# Altium footprint library FootprintSMD.PcbLib: 140 footprints (part 3 of 9)
Each footprint in its own frame and in the unit in brackets; x right, y up, seen from the top. Pads: shape width x height; smd on the part's side, far side on the other; paste and mask are expansions set on the pad; w line width, h text height; cw(c..) or ccw(c..) is an arc to the next point about the centre after c.
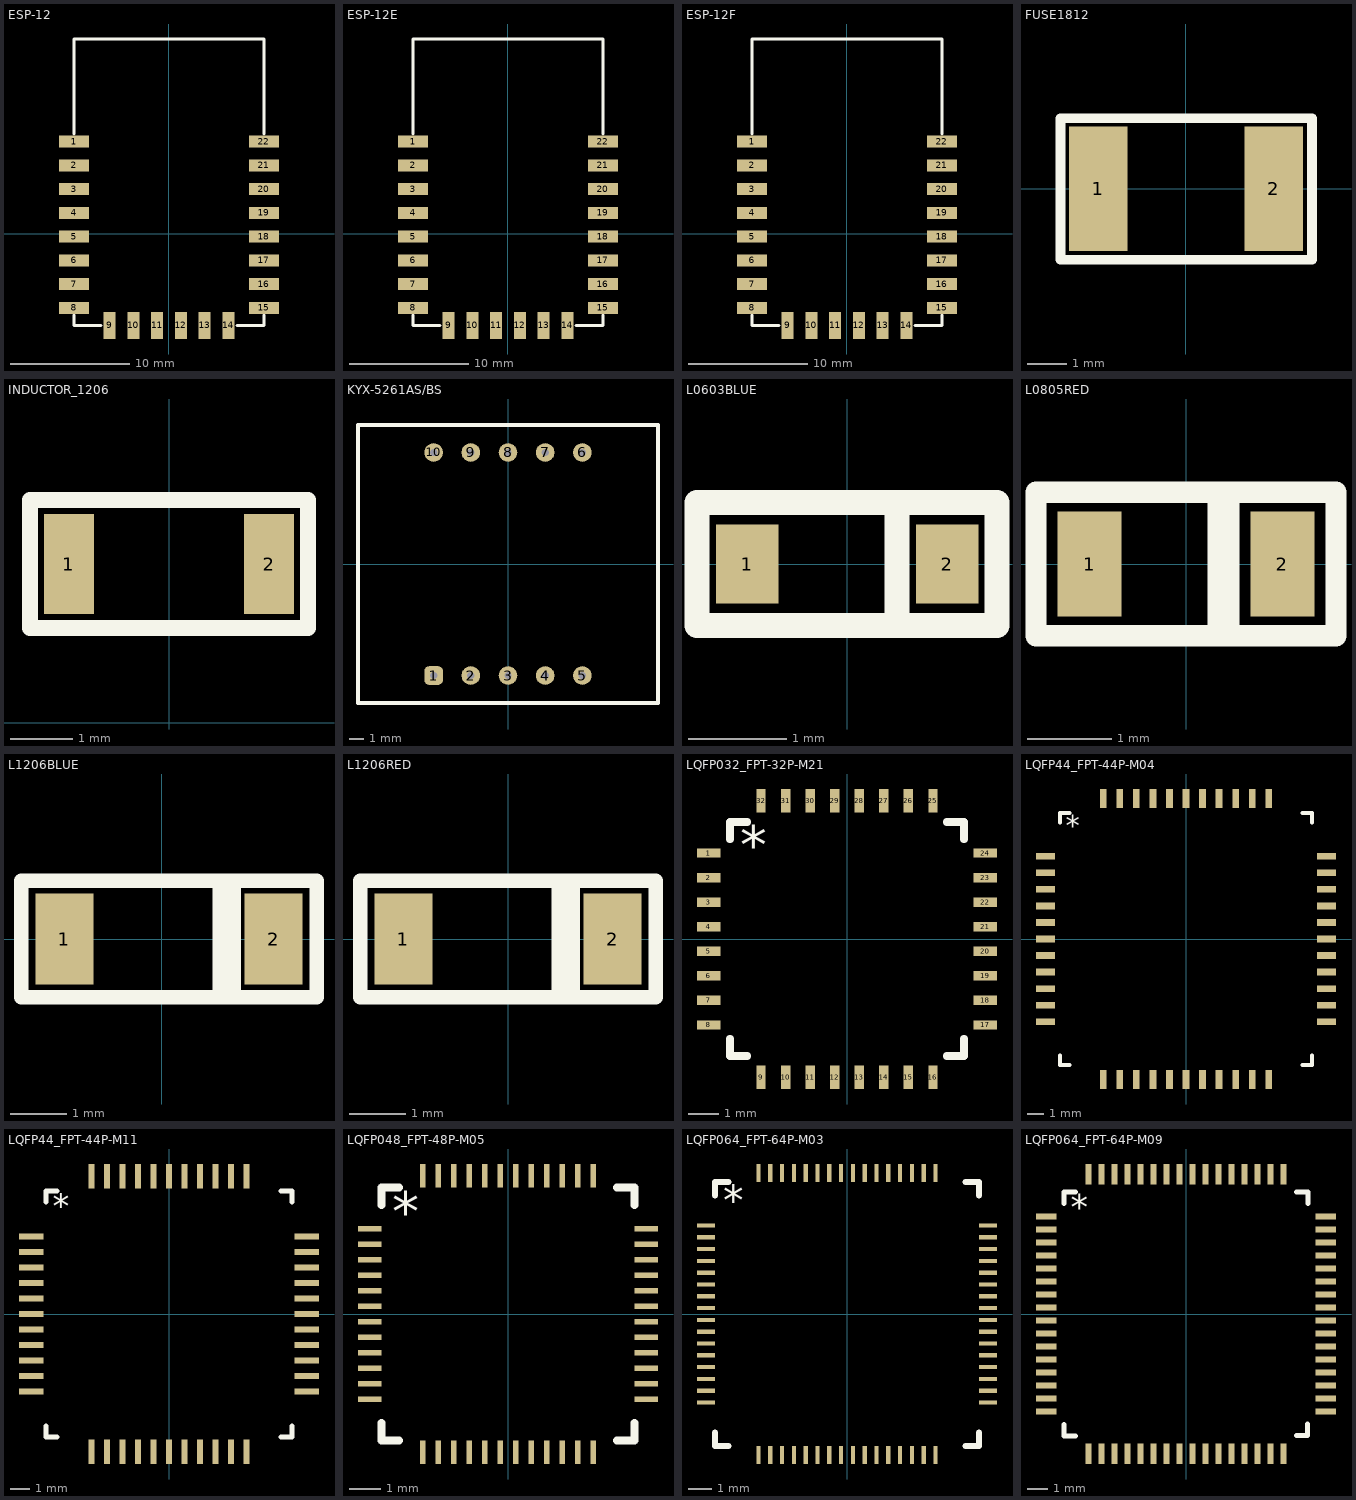
[diagram p2: the footprints below, top view; thin cyan lines are the x and y axes]

## ESP-12 [mil]
pads (22):
  rect 100x40 smd: 1(-314.96,304.65) 2(-314.96,225.91) 3(-314.96,147.17) 4(-314.96,68.43) 5(-314.96,-10.31) 6(-314.96,-89.06) 7(-314.96,-167.8) 8(-314.96,-246.54) 15(314.96,-246.54) 16(314.96,-167.8) 17(314.96,-89.06) 18(314.96,-10.31) 19(314.96,68.43) 20(314.96,147.17) 21(314.96,225.91) 22(314.96,304.65)
  rect 40x90 smd: 9(-196.85,-304.65) 10(-118.11,-304.65) 11(-39.37,-304.65) 12(39.37,-304.65) 13(118.11,-304.65) 14(196.85,-304.65)
Top Overlay:
  lines w10: -314.96,-270 -314.96,-305 -225,-305 ; -314.96,330 -314.96,645 314.96,645 314.96,330 ; 225,-305 314.96,-305 314.96,-270
3D body "ESP-12.step": height 114.17, standoff -1.97, extent -314.95,-302.44 314.97,642.45

## ESP-12E [mil]
pads (22):
  rect 100x40 smd: 1(-314.96,304.65) 2(-314.96,225.91) 3(-314.96,147.17) 4(-314.96,68.43) 5(-314.96,-10.31) 6(-314.96,-89.06) 7(-314.96,-167.8) 8(-314.96,-246.54) 15(314.96,-246.54) 16(314.96,-167.8) 17(314.96,-89.06) 18(314.96,-10.31) 19(314.96,68.43) 20(314.96,147.17) 21(314.96,225.91) 22(314.96,304.65)
  rect 40x90 smd: 9(-196.85,-304.65) 10(-118.11,-304.65) 11(-39.37,-304.65) 12(39.37,-304.65) 13(118.11,-304.65) 14(196.85,-304.65)
Top Overlay:
  lines w10: -314.96,-270 -314.96,-305 -225,-305 ; -314.96,330 -314.96,645 314.96,645 314.96,330 ; 225,-305 314.96,-305 314.96,-270
3D body "ESP-12E.step": height 114.17, standoff -1.97, extent -314.96,-305 314.96,639.88

## ESP-12F [mil]
pads (22):
  rect 100x40 smd: 1(-314.96,304.65) 2(-314.96,225.91) 3(-314.96,147.17) 4(-314.96,68.43) 5(-314.96,-10.31) 6(-314.96,-89.06) 7(-314.96,-167.8) 8(-314.96,-246.54) 15(314.96,-246.54) 16(314.96,-167.8) 17(314.96,-89.06) 18(314.96,-10.31) 19(314.96,68.43) 20(314.96,147.17) 21(314.96,225.91) 22(314.96,304.65)
  rect 40x90 smd: 9(-196.85,-304.65) 10(-118.11,-304.65) 11(-39.37,-304.65) 12(39.37,-304.65) 13(118.11,-304.65) 14(196.85,-304.65)
Top Overlay:
  lines w10: -314.96,-270 -314.96,-305 -225,-305 ; -314.96,330 -314.96,645 314.96,645 314.96,330 ; 225,-305 314.96,-305 314.96,-270
3D body "ESP-12F.step": height 114.17, standoff -1.97, extent -314.96,-305.01 314.96,639.87

## FUSE1812 [mm]
pads (2):
  rect 1.5x3.2 smd: 1(-2.25,0) 2(2.25,0)
Top Overlay:
  lines w0.254: -3.219,-1.823 3.233,-1.823 3.233,1.809 -3.219,1.809 -3.219,-1.823
3D body "ALSRobot-Fuse 1812.STEP": height 1.03, standoff 0, extent -2.37,-1.74 2.365,1.74

## INDUCTOR_1206 [mm]
pads (2):
  rect 0.8x1.6 smd: 1(-1.6,2.54) 2(1.6,2.54)
Top Overlay:
  lines w0.254: -2.225,1.515 2.225,1.515 2.225,3.565 -2.225,3.565 -2.225,1.515
3D body "7447916.stp": height 1.1, standoff 0, extent -1.6,1.74 1.6,3.34

## KYX-5261AS/BS [mm] "0.56inch 2digits red 7 segment led display 10pin"
pads (10):
  rrect50% 1.27x1.27 hole 0.51: 1(-5.08,-7.62)
  round 1.27 hole 0.51: 2(-2.54,-7.62) 3(0,-7.62) 4(2.54,-7.62) 5(5.08,-7.62) 6(5.08,7.62) 7(2.54,7.62) 8(0,7.62) 9(-2.54,7.62) 10(-5.08,7.62)
Top Overlay:
  lines w0.254: -10.25,-9.5 -10.25,9.5 10.25,9.5 10.25,-9.5 -10.16,-9.5

## L0603BLUE [mil]
pads (2):
  rect 25x31.5 smd: 1(-40,0) 2(40,0)
Top Overlay:
  rectangle: 15,-25 25,25
  lines w10: -60,-24.61 -60,24.61 60,24.61 60,-24.61 -60,-24.61
3D body "User Library-SMD LED 0603.STEP": height 14.96, standoff -0.39, extent -31.5,-15.75 31.5,15.75

## L0805RED [mil]
pads (2):
  rect 30x48.82 smd: 1(-45,0) 2(45,0)
Top Overlay:
  rectangle: 10,-35 25,35
  lines w10: -70,-33.46 70,-33.46 70,33.46 -70,33.46 -70,-33.46
3D body "everlight-17-21-0805LED-red.STEP": height 43.31, standoff -0.39, extent -39.36,-24.6 39.38,24.61

## L1206BLUE [mil]
pads (2):
  rect 40x62.99 smd: 1(-67.5,0) 2(77.5,0)
Top Overlay:
  rectangle: 35,-40 55,40
  lines w10: -97.5,-40.35 107.5,-40.35 107.5,40.35 -97.5,40.35 -97.5,-40.35
3D body "User Library-LED 1206 BLUE.STEP": height 43.31, standoff 0, extent -57.99,-31.49 67.99,31.51

## L1206RED [mil]
pads (2):
  rect 40x62.99 smd: 1(-72.5,0) 2(72.5,0)
Top Overlay:
  rectangle: 30,-40 50,40
  lines w10: -102.5,-40.35 102.5,-40.35 102.5,40.35 -102.5,40.35 -102.5,-40.35
3D body "User Library-LED 1206 RED.STEP": height 43.31, standoff 0, extent -62.99,-31.49 62.99,31.5

## LQFP032_FPT-32P-M21 [mil]
pads (32):
  rect 30x12 smd: 1(-177.32,110.24) 2(-177.32,78.74) 3(-177.32,47.24) 4(-177.32,15.75) 5(-177.32,-15.75) 6(-177.32,-47.24) 7(-177.32,-78.74) 8(-177.32,-110.24) 17(177.32,-110.24) 18(177.32,-78.74) 19(177.32,-47.24) 20(177.32,-15.75) 21(177.32,15.75) 22(177.32,47.24) 23(177.32,78.74) 24(177.32,110.24)
  rect 12x30 smd: 9(-110.24,-177.32) 10(-78.74,-177.32) 11(-47.24,-177.32) 12(-15.75,-177.32) 13(15.75,-177.32) 14(47.24,-177.32) 15(78.74,-177.32) 16(110.24,-177.32) 25(110.24,177.32) 26(78.74,177.32) 27(47.24,177.32) 28(15.75,177.32) 29(-15.75,177.32) 30(-47.24,177.32) 31(-78.74,177.32) 32(-110.24,177.32)
Top Overlay:
  lines w10: -150,-127.87 -150,-150 -127.87,-150 ; -150,127.87 -150,150 -127.87,150 ; 127.87,-150 150,-150 150,-127.87 ; 127.87,150 150,150 150,127.87
  text "*" at -136.86,94.98 h50
3D body "LQFP32_FPT-32P-M21.stp": height 59.06, standoff 0, extent -177.16,-177.17 177.17,177.16

## LQFP44_FPT-44P-M04 [mil]
pads (44):
  rect 45x15.75 smd: 1(-335,196.85) 2(-335,157.48) 3(-335,118.11) 4(-335,78.74) 5(-335,39.37) 6(-335,0) 7(-335,-39.37) 8(-335,-78.74) 9(-335,-118.11) 10(-335,-157.48) 11(-335,-196.85) 23(335,196.85) 24(335,157.48) 25(335,118.11) 26(335,78.74) 27(335,39.37) 28(335,0) 29(335,-39.37) 30(335,-78.74) 31(335,-118.11) 32(335,-157.48) 33(335,-196.85)
  rect 15.75x45 smd: 12(-196.85,-335) 13(-157.48,-335) 14(-118.11,-335) 15(-78.74,-335) 16(-39.37,-335) 17(0,-335) 18(39.37,-335) 19(78.74,-335) 20(118.11,-335) 21(157.48,-335) 22(196.85,-335) 34(196.85,335) 35(157.48,335) 36(118.11,335) 37(78.74,335) 38(39.37,335) 39(0,335) 40(-39.37,335) 41(-78.74,335) 42(-118.11,335) 43(-157.48,335) 44(-196.85,335)
Top Overlay:
  lines w10: -300.03,-277.87 -300.03,-300 -277.89,-300 ; -300,277.89 -300,300.03 -277.87,300.03 ; 277.87,-300.03 300,-300.03 300,-277.89 ; 277.89,300 300.03,300 300.03,277.87
  text "*" at -286.66,245.01 h50
3D body "QFP44_FPT-44P-M04.stp": height 129.92, standoff 0, extent -338.58,-338.58 338.59,338.58

## LQFP44_FPT-44P-M11 [mm]
pads (44):
  rect 1.27x0.3 smd: 1(-7.112,4) 2(-7.112,3.2) 3(-7.112,2.4) 4(-7.112,1.6) 5(-7.112,0.8) 6(-7.112,0) 7(-7.112,-0.8) 8(-7.112,-1.6) 9(-7.112,-2.4) 10(-7.112,-3.2) 11(-7.112,-4) 23(7.112,-4) 24(7.112,-3.2) 25(7.112,-2.4) 26(7.112,-1.6) 27(7.112,-0.8) 28(7.112,0) 29(7.112,0.8) 30(7.112,1.6) 31(7.112,2.4) 32(7.112,3.2) 33(7.112,4)
  rect 0.3x1.27 smd: 12(-4,-7.112) 13(-3.2,-7.112) 14(-2.4,-7.112) 15(-1.6,-7.112) 16(-0.8,-7.112) 17(0,-7.112) 18(0.8,-7.112) 19(1.6,-7.112) 20(2.4,-7.112) 21(3.2,-7.112) 22(4,-7.112) 34(4,7.112) 35(3.2,7.112) 36(2.4,7.112) 37(1.6,7.112) 38(0.8,7.112) 39(0,7.112) 40(-0.8,7.112) 41(-1.6,7.112) 42(-2.4,7.112) 43(-3.2,7.112) 44(-4,7.112)
Top Overlay:
  lines w0.254: -6.35,-5.788 -6.35,-6.35 -5.788,-6.35 ; -6.35,5.788 -6.35,6.35 -5.788,6.35 ; 5.788,-6.35 6.35,-6.35 6.35,-5.788 ; 5.788,6.35 6.35,6.35 6.35,5.788
  text "*" at -6.011,4.953 h1.27
3D body "QFP44_FPT-44P-M11.stp": height 2.3, standoff 0, extent -7.2,-7.2 7.2,7.2

## LQFP048_FPT-48P-M05 [mil]
pads (48):
  rect 30x7 smd: 1(-175,108.27) 2(-175,88.58) 3(-175,68.9) 4(-175,49.21) 5(-175,29.53) 6(-175,9.84) 7(-175,-9.84) 8(-175,-29.53) 9(-175,-49.21) 10(-175,-68.9) 11(-175,-88.58) 12(-175,-108.27) 25(175,-108.27) 26(175,-88.58) 27(175,-68.9) 28(175,-49.21) 29(175,-29.53) 30(175,-9.84) 31(175,9.84) 32(175,29.53) 33(175,49.21) 34(175,68.9) 35(175,88.58) 36(175,108.27)
  rect 7x30 smd: 13(-108.27,-175) 14(-88.58,-175) 15(-68.9,-175) 16(-49.21,-175) 17(-29.53,-175) 18(-9.84,-175) 19(9.84,-175) 20(29.53,-175) 21(49.21,-175) 22(68.9,-175) 23(88.58,-175) 24(108.27,-175) 37(108.27,175) 38(88.58,175) 39(68.9,175) 40(49.21,175) 41(29.53,175) 42(9.84,175) 43(-9.84,175) 44(-29.53,175) 45(-49.21,175) 46(-68.9,175) 47(-88.58,175) 48(-108.27,175)
Top Overlay:
  lines w10: -160,-137.87 -160,-160 -137.87,-160 ; -160,137.87 -160,160 -137.87,160 ; 137.87,-160 160,-160 160,-137.87 ; 137.87,160 160,160 160,137.87
  text "*" at -146.66,105.01 h50
3D body "LQFP48_FPT-48P-M05.stp": height 59.06, standoff 0, extent -177.16,-177.17 177.17,177.16

## LQFP064_FPT-64P-M03 [mil]
pads (64):
  rect 30x7 smd: 1(-235,147.64) 2(-235,127.95) 3(-235,108.27) 4(-235,88.58) 5(-235,68.9) 6(-235,49.21) 7(-235,29.53) 8(-235,9.84) 9(-235,-9.84) 10(-235,-29.53) 11(-235,-49.21) 12(-235,-68.9) 13(-235,-88.58) 14(-235,-108.27) 15(-235,-127.95) 16(-235,-147.64) 33(235,-147.64) 34(235,-127.95) 35(235,-108.27) 36(235,-88.58) 37(235,-68.9) 38(235,-49.21) 39(235,-29.53) 40(235,-9.84) 41(235,9.84) 42(235,29.53) 43(235,49.21) 44(235,68.9) 45(235,88.58) 46(235,108.27) 47(235,127.95) 48(235,147.64)
  rect 7x30 smd: 17(-147.64,-235) 18(-127.95,-235) 19(-108.27,-235) 20(-88.58,-235) 21(-68.9,-235) 22(-49.21,-235) 23(-29.53,-235) 24(-9.84,-235) 25(9.84,-235) 26(29.53,-235) 27(49.21,-235) 28(68.9,-235) 29(88.58,-235) 30(108.27,-235) 31(127.95,-235) 32(147.64,-235) 49(147.64,235) 50(127.95,235) 51(108.27,235) 52(88.58,235) 53(68.9,235) 54(49.21,235) 55(29.53,235) 56(9.84,235) 57(-9.84,235) 58(-29.53,235) 59(-49.21,235) 60(-68.9,235) 61(-88.58,235) 62(-108.27,235) 63(-127.95,235) 64(-147.64,235)
Top Overlay:
  lines w10: -220,-197.87 -220,-220 -197.87,-220 ; -220,197.87 -220,220 -197.87,220 ; 197.87,-220 220,-220 220,-197.87 ; 197.87,220 220,220 220,197.87
  text "*" at -206.66,165.01 h50
3D body "LQFP64_FPT-64P-M03.stp": height 59.06, standoff 0, extent -236.22,-236.23 236.22,236.21

## LQFP064_FPT-64P-M09 [mil]
pads (64):
  rect 40x12 smd: 1(-275,191.93) 2(-275,166.34) 3(-275,140.75) 4(-275,115.16) 5(-275,89.57) 6(-275,63.98) 7(-275,38.39) 8(-275,12.8) 9(-275,-12.8) 10(-275,-38.39) 11(-275,-63.98) 12(-275,-89.57) 13(-275,-115.16) 14(-275,-140.75) 15(-275,-166.34) 16(-275,-191.93) 33(275,-191.93) 34(275,-166.34) 35(275,-140.75) 36(275,-115.16) 37(275,-89.57) 38(275,-63.98) 39(275,-38.39) 40(275,-12.8) 41(275,12.8) 42(275,38.39) 43(275,63.98) 44(275,89.57) 45(275,115.16) 46(275,140.75) 47(275,166.34) 48(275,191.93)
  rect 12x40 smd: 17(-191.93,-275) 18(-166.34,-275) 19(-140.75,-275) 20(-115.16,-275) 21(-89.57,-275) 22(-63.98,-275) 23(-38.39,-275) 24(-12.8,-275) 25(12.8,-275) 26(38.39,-275) 27(63.98,-275) 28(89.57,-275) 29(115.16,-275) 30(140.75,-275) 31(166.34,-275) 32(191.93,-275) 49(191.93,275) 50(166.34,275) 51(140.75,275) 52(115.16,275) 53(89.57,275) 54(63.98,275) 55(38.39,275) 56(12.8,275) 57(-12.8,275) 58(-38.39,275) 59(-63.98,275) 60(-89.57,275) 61(-115.16,275) 62(-140.75,275) 63(-166.34,275) 64(-191.93,275)
Top Overlay:
  lines w10: -240,-217.87 -240,-240 -217.87,-240 ; -240,217.87 -240,240 -217.87,240 ; 217.14,-238.62 239.27,-238.62 239.27,-216.49 ; 217.87,240 240,240 240,217.87
  text "*" at -226.66,185.01 h50
3D body "LQFP64_FPT-64P-M09.stp": height 59.06, standoff 0, extent -275.58,-275.59 275.6,275.59